# Altium footprint library LCD.PcbLib: 33 footprints (part 3 of 3)
Each footprint in its own frame and in the unit in brackets; x right, y up, seen from the top. Pads: shape width x height; smd on the part's side, far side on the other; paste and mask are expansions set on the pad; w line width, h text height; cw(c..) or ccw(c..) is an arc to the next point about the centre after c.
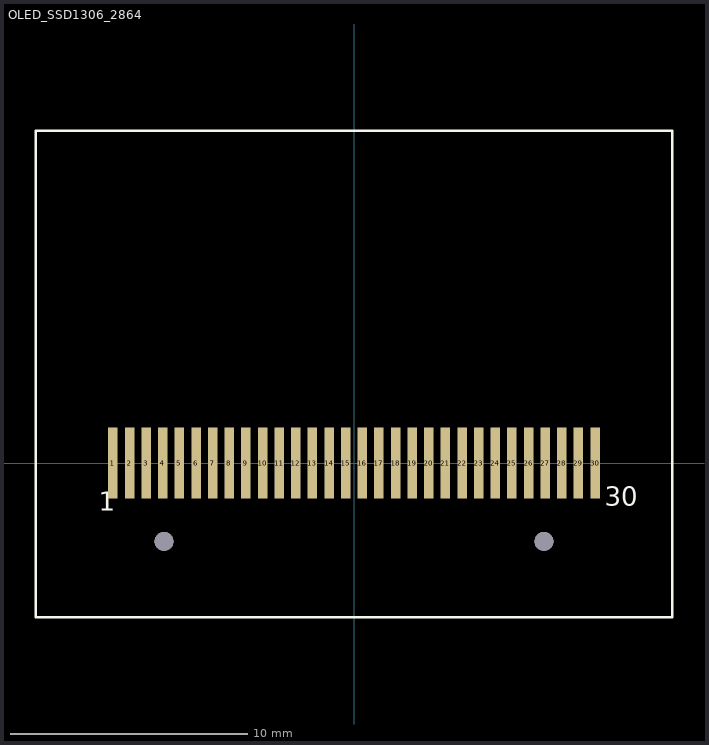
[diagram p2: the footprint, top view; thin cyan lines are the x and y axes]

## OLED_SSD1306_2864 [mm] "OLED Display UG-2864HMBEG01"
height 10
pads (32):
  rect 0.4x3 smd: 1(-10.15,0) 2(-9.45,0) 3(-8.75,0) 4(-8.05,0) 5(-7.35,0) 6(-6.65,0) 7(-5.95,0) 8(-5.25,0) 9(-4.55,0) 10(-3.85,0) 11(-3.15,0) 12(-2.45,0) 13(-1.75,0) 14(-1.05,0) 15(-0.35,0) 16(0.35,0) 17(1.05,0) 18(1.75,0) 19(2.45,0) 20(3.15,0) 21(3.85,0) 22(4.55,0) 23(5.25,0) 24(5.95,0) 25(6.65,0) 26(7.35,0) 27(8.05,0) 28(8.75,0) 29(9.45,0) 30(10.15,0)
  round 0.8 hole 0.8 unplated: ""(-8,-3.3) ""(8,-3.3)
Top Overlay:
  lines w0.1: -13.4,-6.5 -13.4,14 13.4,14 13.4,-6.5 -13.4,-6.5
  text "1" at -10.75,-2 h0.8
  text "30" at 10.55,-1.8 h0.8
3D body "OLED 128x64 ug-2864hsweg01 v15.step": height 3.3, standoff 0.05, extent -13.35,-6.45 13.35,13.96